# Altium footprint library Active.PcbLib: 325 footprints (part 8 of 23)
Each footprint in its own frame and in the unit in brackets; x right, y up, seen from the top. Pads: shape width x height; smd on the part's side, far side on the other; paste and mask are expansions set on the pad; w line width, h text height; cw(c..) or ccw(c..) is an arc to the next point about the centre after c.
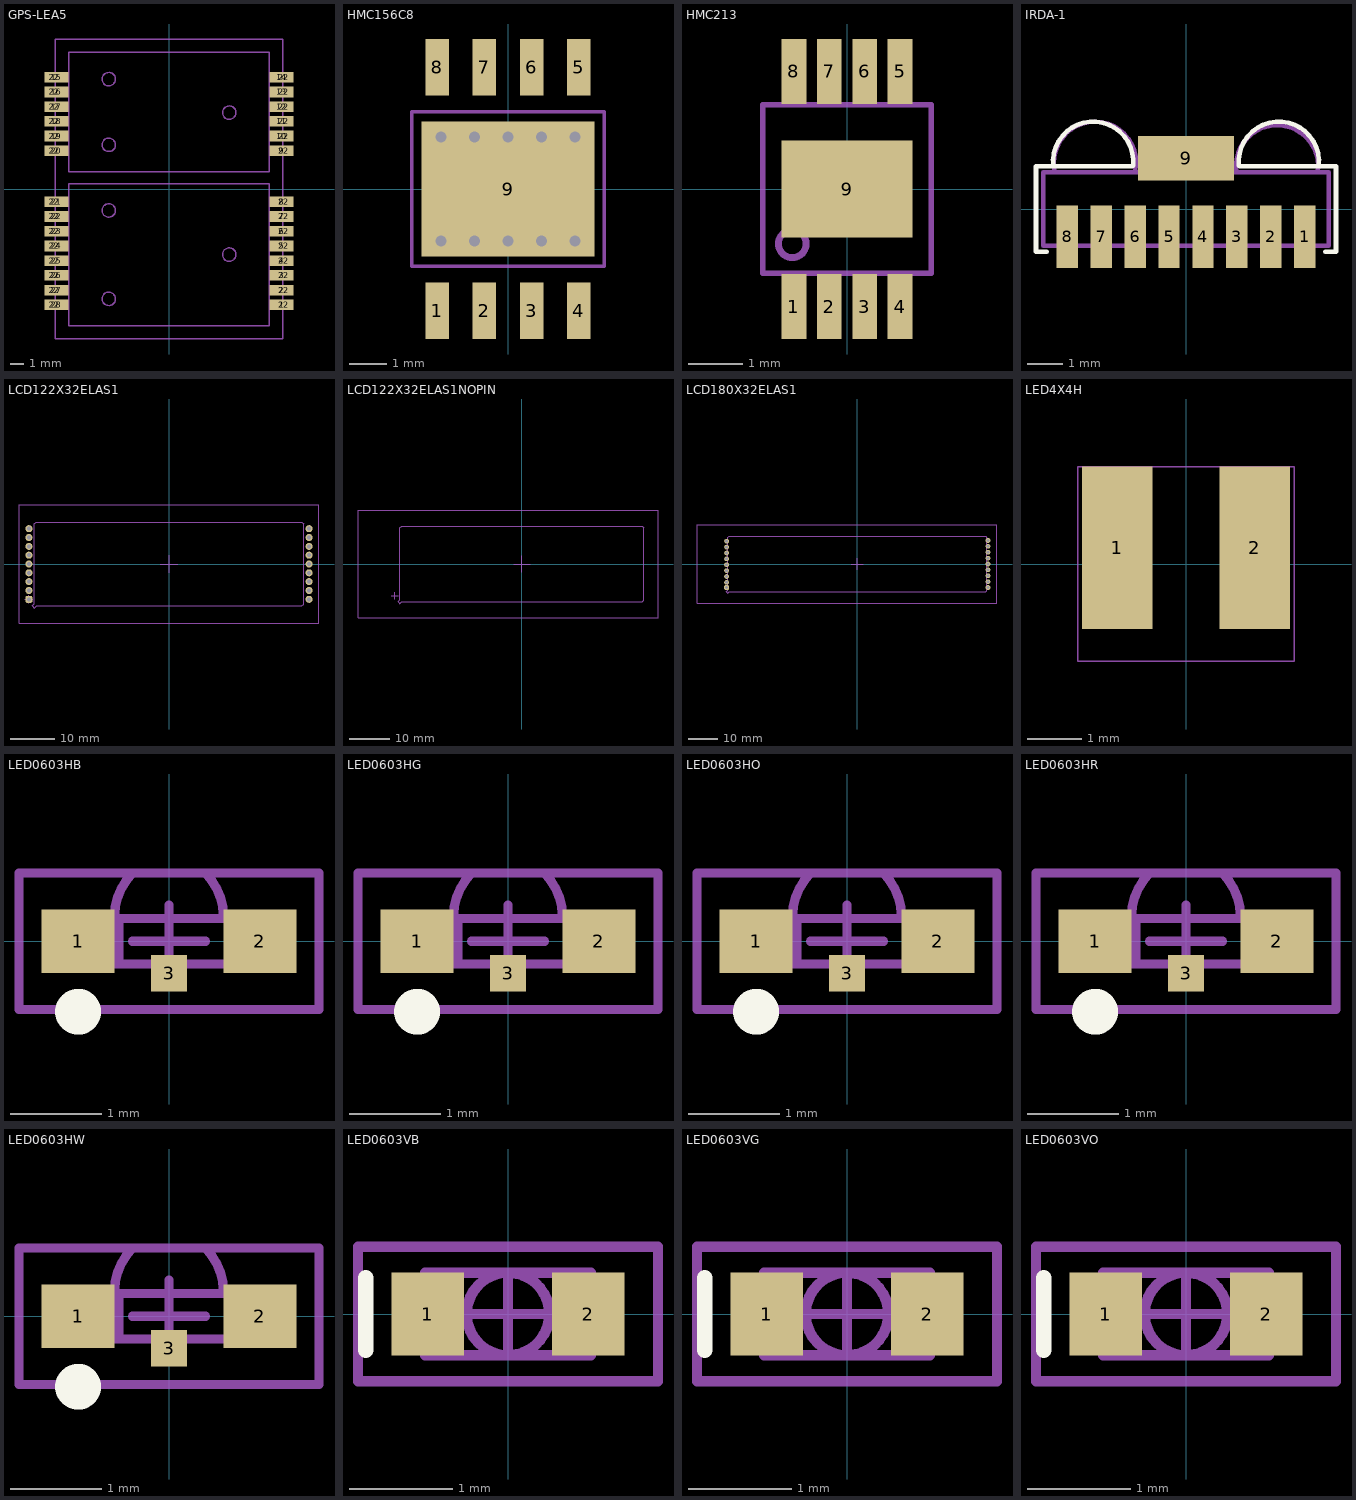
[diagram p7: the footprints below, top view; thin cyan lines are the x and y axes]

## GPS-LEA5 [mm] "17X22.4mm 28-pin GPS module"
height 3
pads (56):
  rect 1.8x0.8 smd paste-2: 1(8.4,-8.65) 2(8.4,-7.55) 3(8.4,-6.45) 4(8.4,-5.35) 5(8.4,-4.25) 6(8.4,-3.15) 7(8.4,-2.05) 8(8.4,-0.95) 9(8.4,2.85) 10(8.4,3.95) 11(8.4,5.05) 12(8.4,6.15) 13(8.4,7.25) 14(8.4,8.35) 15(-8.4,8.35) 16(-8.4,7.25) 17(-8.4,6.15) 18(-8.4,5.05) 19(-8.4,3.95) 20(-8.4,2.85) 21(-8.4,-0.95) 22(-8.4,-2.05) 23(-8.4,-3.15) 24(-8.4,-4.25) 25(-8.4,-5.35) 26(-8.4,-6.45) 27(-8.4,-7.55) 28(-8.4,-8.65)
  rect 1.5x0.8 on Top Paste: 22(-8.55,-8.65) 22(-8.55,-7.55) 22(-8.55,-6.45) 22(-8.55,-5.35) 22(-8.55,-4.25) 22(-8.55,-3.15) 22(-8.55,-2.05) 22(-8.55,-0.95) 22(-8.55,2.85) 22(-8.55,3.95) 22(-8.55,5.05) 22(-8.55,6.15) 22(-8.55,7.25) 22(-8.55,8.35) 22(8.55,-8.65) 22(8.55,-7.55) 22(8.55,-6.45) 22(8.55,-5.35) 22(8.55,-4.25) 22(8.55,-3.15) 22(8.55,-2.05) 22(8.55,-0.95) 22(8.55,2.85) 22(8.55,3.95) 22(8.55,5.05) 22(8.55,6.15) 22(8.55,7.25) 22(8.55,8.35)
Mechanical 13:
  circle w0.102: c-4.5,-8.2 r0.5
  circle w0.102: c-4.5,-1.6 r0.5
  circle w0.102: c4.5,-4.9 r0.5
  circle w0.102: c4.5,5.7 r0.5
  circle w0.102: c-4.5,8.2 r0.5
  circle w0.102: c-4.5,3.3 r0.5
  lines w0.102: -8.5,-11.2 -8.5,11.2 8.5,11.2 8.5,-11.2 -8.5,-11.2 ; -7.5,-10.2 -7.5,0.4 7.5,0.4 7.5,-10.2 -7.5,-10.2 ; -7.5,1.3 7.5,1.3 7.5,10.2 -7.5,10.2 -7.5,1.3
3D body: height 3.4, standoff 1, extent -7.5,1.3 7.5,10.2
3D body: height 3.4, standoff 1, extent -7.5,-10.2 7.5,0.4
3D body: height 1, standoff 0, extent -8.5,-11.2 8.5,11.2
3D body: height 3.41, standoff 3.4, extent -5,-8.7 -4,-7.7
3D body: height 3.41, standoff 3.4, extent -5,-2.1 -4,-1.1
3D body: height 3.41, standoff 3.4, extent 4,-5.4 5,-4.4
3D body: height 3.41, standoff 3.4, extent 4,5.2 5,6.2
3D body: height 3.41, standoff 3.4, extent -5,7.7 -4,8.7
3D body: height 3.41, standoff 3.4, extent -5,2.8 -4,3.8

## HMC156C8 [mil]
pads (9):
  rect 25x60 smd: 1(-75,-129) 2(-25,-129) 3(25,-129) 4(75,-129) 5(75,129) 6(25,129) 7(-25,129) 8(-75,129)
  rect 183x143 smd paste-196.85 mask-196.85: 9(0,0)
via 0,55.12 diameter 25.59 hole 11.81
via 70.87,55.12 diameter 25.59 hole 11.81
via 35.43,55.12 diameter 25.59 hole 11.81
via -35.43,55.12 diameter 25.59 hole 11.81
via -70.87,55.12 diameter 25.59 hole 11.81
via -70.87,-55.12 diameter 25.59 hole 11.81
via -35.43,-55.12 diameter 25.59 hole 11.81
via 35.43,-55.12 diameter 25.59 hole 11.81
via 70.87,-55.12 diameter 25.59 hole 11.81
via 0,-55.12 diameter 25.59 hole 11.81
Top Paste:
  region: -90.55,49.21 -82.68,49.21 -76.77,43.31 -64.96,43.31 -59.06,49.21 -53.15,49.21 -53.15,0 -90.55,0
  region: -56.1,49.21 -47.24,49.21 -41.34,43.31 -29.53,43.31 -23.62,49.21 -17.72,49.21 -17.72,0 -56.1,0
  region: -20.67,49.21 -11.81,49.21 -5.91,43.31 5.91,43.31 11.81,49.21 17.72,49.21 17.72,0 -20.67,0
  region: 14.76,49.21 23.62,49.21 29.53,43.31 41.34,43.31 47.24,49.21 53.15,49.21 53.15,0 14.76,0
  region: 90.55,49.21 82.68,49.21 76.77,43.31 64.96,43.31 59.06,49.21 53.15,49.21 53.15,0 90.55,0
  region: 90.55,-49.21 82.68,-49.21 76.77,-43.31 64.96,-43.31 59.06,-49.21 53.15,-49.21 53.15,0 90.55,0
  region: 56.1,-49.21 47.24,-49.21 41.34,-43.31 29.53,-43.31 23.62,-49.21 17.72,-49.21 17.72,0 56.1,0
  region: 20.67,-49.21 11.81,-49.21 5.91,-43.31 -5.91,-43.31 -11.81,-49.21 -17.72,-49.21 -17.72,0 20.67,0
  region: -14.76,-49.21 -23.62,-49.21 -29.53,-43.31 -41.34,-43.31 -47.24,-49.21 -53.15,-49.21 -53.15,0 -14.76,0
  region: -90.55,-49.21 -81.69,-49.21 -75.79,-43.31 -63.98,-43.31 -58.07,-49.21 -52.17,-49.21 -52.17,0 -90.55,0
  region: -90.55,61.02 -82.68,61.02 -76.77,66.93 -76.77,70.87 -90.55,70.87
  region: -64.96,70.87 -64.96,66.93 -59.06,61.02 -47.24,61.02 -41.34,66.93 -41.34,70.87
  region: -29.53,70.87 -29.53,66.93 -23.62,61.02 -11.81,61.02 -5.91,66.93 -5.91,70.87
  region: 5.91,70.87 5.91,66.93 11.81,61.02 23.62,61.02 29.53,66.93 29.53,70.87
  region: 41.34,70.87 41.34,66.93 47.24,61.02 59.06,61.02 64.96,66.93 64.96,70.87
  region: -64.96,-70.87 -64.96,-66.93 -59.06,-61.02 -47.24,-61.02 -41.34,-66.93 -41.34,-70.87
  region: -29.53,-70.87 -29.53,-66.93 -23.62,-61.02 -11.81,-61.02 -5.91,-66.93 -5.91,-70.87
  region: 5.91,-70.87 5.91,-66.93 11.81,-61.02 23.62,-61.02 29.53,-66.93 29.53,-70.87
  region: 41.34,-70.87 41.34,-66.93 47.24,-61.02 59.06,-61.02 64.96,-66.93 64.96,-70.87
  region: -90.55,-61.02 -82.68,-61.02 -76.77,-66.93 -76.77,-70.87 -90.55,-70.87
  region: 90.55,-61.02 82.68,-61.02 76.77,-66.93 76.77,-70.87 90.55,-70.87
  region: 90.55,61.02 82.68,61.02 76.77,66.93 76.77,70.87 90.55,70.87
Top Solder:
  drawing of 10 lines, arcs and shapes, not listed
Mechanical 13:
  circle w5: c-77,-58 r10
  lines w4: -102,-82 -102,82 102,82 102,-82 -102,-82
3D body: height 94.88, standoff 0, extent -102,-82 102,82
3D body: height 95.28, standoff 94.88, extent -87,-68 -67,-48

## HMC213 [mil]
pads (9):
  rect 18x47 smd mask+2: 1(-38.4,-85) 2(-12.8,-85) 3(12.8,-85) 4(38.4,-85) 5(38.4,85) 6(12.8,85) 7(-12.8,85) 8(-38.4,85)
  rect 95x70 smd mask+2: 9(0,0)
Mechanical 13:
  lines w4: -61,-61 -61,61 61,61 61,-61 -61,-61
  lines w5: -49.56,-39.69 cw(c-39.56,-39.69) -39.56,-29.69 cw(c-39.56,-39.69) -29.56,-39.69 cw(c-39.56,-39.69) -39.56,-49.69 cw(c-39.56,-39.69) -49.56,-39.69
3D body: height 43.31, standoff 5.91, extent -61,-61 61,61
3D body: height 45.28, standoff 43.31, extent -49.56,-49.69 -29.56,-29.69

## IRDA-1 [mm] "HSDL-3201#001"
height 2.5
pads (9):
  rect 0.6x1.75 smd: 1(3.325,-0.775) 2(2.375,-0.775) 3(1.425,-0.775) 4(0.475,-0.775) 5(-0.475,-0.775) 6(-1.425,-0.775) 7(-2.375,-0.775) 8(-3.325,-0.775)
  rect 2.7x1.25 smd: 9(0,1.425)
Top Overlay:
  lines w0.127: -3.9,-1.2 -4.2,-1.2 -4.2,1.2 -1.5,1.2 ; -3.718,1.203 cw(c-2.6,1.325) -1.481,1.207 ; 1.481,1.207 cw(c2.6,1.325) 3.718,1.203 ; 1.5,1.2 4.2,1.2 4.2,-1.2 3.9,-1.2
Mechanical 13:
  lines w0.127: -3.683,1.1 cw(c-2.55,1.3) -1.417,1.1 ; -1.05,1.025 -1.05,1.825 1.05,1.825 1.05,1.025 ; 1.411,1.04 cw(c2.55,1.2) 3.689,1.04 ; -4,-1.025 -4,1.025 4,1.025 4,-1.025 -4,-1.025
3D body: height 2.6, standoff 0, extent -4,-1.025 4,1.025
3D body: height 2.3, standoff 0.3, extent -3.683,1.025 -1.397,2.464
3D body: height 2.3, standoff 0.3, extent 1.397,1.04 3.708,2.362

## LCD122X32ELAS1 [mm]
pads (18):
  rrect50% 1.6x1.6 hole 0.9: 1(-31.75,-8)
  round 1.6 hole 0.9: 2(-31.75,-6) 3(-31.75,-4) 4(-31.75,-2) 5(-31.75,0) 6(-31.75,2) 7(-31.75,4) 8(-31.75,6) 9(-31.75,8) 10(31.75,8) 11(31.75,6) 12(31.75,4) 13(31.75,2) 14(31.75,0) 15(31.75,-2) 16(31.75,-4) 17(31.75,-6) 18(31.75,-8)
Mechanical 13:
  lines w0.102: -34,-13.4 34,-13.4 34,13.4 -34,13.4 -34,-13.4 ; -31,-9.5 -30.5,-9 -30.5,9.1 -30.1,9.5 30.1,9.5 30.5,9.1 30.5,-9.1 30.1,-9.5 -30,-9.5 -30.5,-10 -31,-9.5
Mechanical 15:
  lines w0.102: -32.65,-8 -30.875,-8 ; -31.75,-8.875 -31.75,-7.125 ; -2.032,0 2.032,0 ; 0,-2.032 0,2.032
3D body: height 10.8, standoff 0, extent -34.075,-13.375 33.925,13.425

## LCD122X32ELAS1NOPIN [mm]
Mechanical 13:
  lines w0.1: -41,-13.4 -41,13.4
  lines w0.102: -41,-13.4 34,-13.4 ; -41,13.4 34,13.4 34,-13.4 ; -34,-13.4 34,-13.4 ; -31,-9.5 -30.5,-10 -30,-9.5 30.1,-9.5 30.5,-9.1 30.5,9.1 30.1,9.5 -30.1,9.5 -30.5,9.1 -30.5,-9 -31,-9.5
Mechanical 15:
  lines w0.102: -32.65,-8 -30.875,-8 ; -31.75,-8.875 -31.75,-7.125 ; -2.032,0 2.032,0 ; 0,-2.032 0,2.032
3D body: height 14.8, standoff 4, extent -30.5,-9.5 30.5,9.5
3D body: height 14.8, standoff 4, extent -41,-13.4 34,13.4

## LCD180X32ELAS1 [mm]
height 10.8
pads (18):
  rrect50% 1.6x1.6 hole 0.9: 1(-44.45,-8)
  round 1.6 hole 0.9: 2(-44.45,-6.25) 3(-44.45,-4.25) 4(-44.45,-2.25) 5(-44.45,-0.25) 6(-44.45,1.75) 7(-44.45,3.75) 8(-44.45,5.75) 9(-44.45,7.75) 10(44.45,8) 11(44.45,6) 12(44.45,4) 13(44.45,2) 14(44.45,0) 15(44.45,-2) 16(44.45,-4) 17(44.45,-6) 18(44.45,-8)
Mechanical 13:
  lines w0.102: -54.5,-13.4 -54.5,13.4 47.5,13.4 47.5,-13.4 -54.5,-13.4 ; -44.5,-9.5 -44,-10 -43.5,-9.5 43.6,-9.5 44,-9.1 44,9.1 43.6,9.5 -43.6,9.5 -44,9.1 -44,-9 -44.5,-9.5
Mechanical 15:
  lines w0.102: -2.032,0 2.032,0 ; 0,-2.032 0,2.032
3D body: height 14.8, standoff 4, extent -54.5,-13.4 47.5,13.4
3D body: height 14.8, standoff 4, extent -44.01,-9.5 44,9.5

## LED4X4H [mm] "Sideled 4x4mm horizontal SMD"
height 4
pads (2):
  rect 1.3x3 smd: 1(-1.27,0.3) 2(1.27,0.3)
Mechanical 13:
  lines w0.025: -2,-1.8 -2,1.8 2,1.8 2,-1.8 -2,-1.8
3D body: height 3.8, standoff 1.4, extent -1.2,-1.825 1.2,-1.8
3D body: height 1, standoff 0, extent -2,-1.8 2,1.8
3D body: height 3, standoff 1, extent -2,-1.8 2,-0.3
3D body: height 4, standoff 3, extent -2,-1.8 2,1.8

## LED0603HB [mm] "LED chip 0603 1.6x1.0x0.6mm horizontal Blue"
height 1
pads (3):
  rect 0.8x0.7 smd: 1(-1,0) 2(1,0)
  rect 0.4x0.4 smd: 3(0,-0.35)
Top Overlay:
  circle w0.254: c-1,-0.775 r0.125
Mechanical 13:
  rectangle: -0.8,-0.25 -0.5,0.25
  lines w0.1: -0.8,-0.25 -0.8,0.25 0.8,0.25 0.8,-0.25 -0.8,-0.25
  lines w0.102: -0.6,0.25 -0.6,0.267 cw(c0.083,0.267) -0.4,0.75 0.4,0.75 cw(c-0.083,0.267) 0.6,0.267
Mechanical 15:
  lines w0.1: -0.4,0 0.4,0 ; 0,-0.4 0,0.4 ; -1.65,-0.75 -1.65,0.75 1.65,0.75 1.65,-0.75 -1.65,-0.75
3D body: height 0.61, standoff 0.6, extent -0.8,-0.25 -0.5,0.25
3D body: height 0.6, standoff 0, extent -0.8,-0.25 0.8,0.25
3D body: height 0.6, standoff 0, extent -0.6,0.25 0.6,0.75

## LED0603HG [mm] "LED chip 0603 1.6x1.0x0.6mm horizontal Green"
height 1
pads (3):
  rect 0.8x0.7 smd: 1(-1,0) 2(1,0)
  rect 0.4x0.4 smd: 3(0,-0.35)
Top Overlay:
  circle w0.254: c-1,-0.775 r0.125
Mechanical 13:
  rectangle: -0.8,-0.25 -0.5,0.25
  lines w0.1: -0.8,-0.25 0.8,-0.25 0.8,0.25 -0.8,0.25 -0.8,-0.25
  lines w0.102: -0.6,0.25 -0.6,0.267 cw(c0.083,0.267) -0.4,0.75 0.4,0.75 cw(c-0.083,0.267) 0.6,0.267
Mechanical 15:
  lines w0.1: -0.4,0 0.4,0 ; 0,-0.4 0,0.4 ; -1.65,-0.75 1.65,-0.75 1.65,0.75 -1.65,0.75 -1.65,-0.75
3D body: height 0.6, standoff 0, extent -0.6,0.25 0.6,0.75
3D body: height 0.6, standoff 0, extent -0.8,-0.25 0.8,0.25
3D body: height 0.61, standoff 0.6, extent -0.8,-0.25 -0.5,0.25

## LED0603HO [mm] "LED chip 0603 1.6x1.0x0.6mm horizontal Orange"
height 1
pads (3):
  rect 0.8x0.7 smd: 1(-1,0) 2(1,0)
  rect 0.4x0.4 smd: 3(0,-0.35)
Top Overlay:
  circle w0.254: c-1,-0.775 r0.125
Mechanical 13:
  rectangle: -0.8,-0.25 -0.5,0.25
  lines w0.1: -0.8,-0.25 0.8,-0.25 0.8,0.25 -0.8,0.25 -0.8,-0.25
  lines w0.102: -0.6,0.25 -0.6,0.267 cw(c0.083,0.267) -0.4,0.75 0.4,0.75 cw(c-0.083,0.267) 0.6,0.267
Mechanical 15:
  lines w0.1: -0.4,0 0.4,0 ; 0,-0.4 0,0.4 ; -1.65,-0.75 1.65,-0.75 1.65,0.75 -1.65,0.75 -1.65,-0.75
3D body: height 0.6, standoff 0, extent -0.6,0.25 0.6,0.75
3D body: height 0.6, standoff 0, extent -0.8,-0.25 0.8,0.25
3D body: height 0.61, standoff 0.6, extent -0.8,-0.25 -0.5,0.25

## LED0603HR [mm] "LED chip 0603 1.6x1.0x0.6mm horizontal Red"
height 1
pads (3):
  rect 0.8x0.7 smd: 1(-1,0) 2(1,0)
  rect 0.4x0.4 smd: 3(0,-0.35)
Top Overlay:
  circle w0.254: c-1,-0.775 r0.125
Mechanical 13:
  rectangle: -0.8,-0.25 -0.5,0.25
  lines w0.1: -0.8,-0.25 -0.8,0.25 0.8,0.25 0.8,-0.25 -0.8,-0.25
  lines w0.102: -0.6,0.25 -0.6,0.267 cw(c0.083,0.267) -0.4,0.75 0.4,0.75 cw(c-0.083,0.267) 0.6,0.267
Mechanical 15:
  lines w0.1: -0.4,0 0.4,0 ; 0,-0.4 0,0.4 ; -1.65,-0.75 -1.65,0.75 1.65,0.75 1.65,-0.75 -1.65,-0.75
3D body: height 0.61, standoff 0.6, extent -0.8,-0.25 -0.5,0.25
3D body: height 0.6, standoff 0, extent -0.8,-0.25 0.8,0.25
3D body: height 0.6, standoff 0, extent -0.6,0.25 0.6,0.75

## LED0603HW [mm] "LED chip 0603 1.6x1.0x0.6mm horizontal White"
height 1
pads (3):
  rect 0.8x0.7 smd: 1(-1,0) 2(1,0)
  rect 0.4x0.4 smd: 3(0,-0.35)
Top Overlay:
  circle w0.254: c-1,-0.775 r0.125
Mechanical 13:
  rectangle: -0.8,-0.25 -0.5,0.25
  lines w0.1: -0.8,-0.25 0.8,-0.25 0.8,0.25 -0.8,0.25 -0.8,-0.25
  lines w0.102: -0.6,0.25 -0.6,0.267 cw(c0.083,0.267) -0.4,0.75 0.4,0.75 cw(c-0.083,0.267) 0.6,0.267
Mechanical 15:
  lines w0.1: -0.4,0 0.4,0 ; 0,-0.4 0,0.4 ; -1.65,-0.75 1.65,-0.75 1.65,0.75 -1.65,0.75 -1.65,-0.75
3D body: height 0.6, standoff 0, extent -0.6,0.25 0.6,0.75
3D body: height 0.6, standoff 0, extent -0.8,-0.25 0.8,0.25
3D body: height 0.61, standoff 0.6, extent -0.8,-0.25 -0.5,0.25

## LED0603VB [mm] "LED chip 0603 1.6x0.8x0.6mm vertical Blue"
height 0.6
pads (2):
  rect 0.7x0.8 smd: 1(-0.775,0) 2(0.775,0)
Top Overlay:
  lines w0.15: -1.375,-0.35 -1.375,0.35
Mechanical 13:
  circle w0.102: c0,0 r0.4
  rectangle: -0.8,-0.4 -0.5,0.4
  lines w0.1: -0.8,-0.4 -0.8,0.4 0.8,0.4 0.8,-0.4 -0.8,-0.4
Mechanical 15:
  lines w0.1: -0.4,0 0.4,0 ; 0,-0.4 0,0.4 ; -1.45,-0.65 -1.45,0.65 1.45,0.65 1.45,-0.65 -1.45,-0.65
3D body: height 0.6, standoff 0.3, extent -0.8,-0.4 0.8,0.4
3D body: height 0.3, standoff 0, extent -0.8,-0.4 0.8,0.4

## LED0603VG [mm] "LED chip 0603 1.6x0.8x0.6mm vertical Green"
height 0.6
pads (2):
  rect 0.7x0.8 smd: 1(-0.775,0) 2(0.775,0)
Top Overlay:
  lines w0.15: -1.375,-0.35 -1.375,0.35
Mechanical 13:
  circle w0.102: c0,0 r0.4
  rectangle: -0.8,-0.4 -0.5,0.4
  lines w0.1: -0.8,-0.4 0.8,-0.4 0.8,0.4 -0.8,0.4 -0.8,-0.4
Mechanical 15:
  lines w0.1: -0.4,0 0.4,0 ; 0,-0.4 0,0.4 ; -1.45,-0.65 1.45,-0.65 1.45,0.65 -1.45,0.65 -1.45,-0.65
3D body: height 0.6, standoff 0.3, extent -0.8,-0.4 0.8,0.4
3D body: height 0.3, standoff 0, extent -0.8,-0.4 0.8,0.4

## LED0603VO [mm] "LED chip 0603 1.6x0.8x0.6mm vertical Orange"
height 0.6
pads (2):
  rect 0.7x0.8 smd: 1(-0.775,0) 2(0.775,0)
Top Overlay:
  lines w0.15: -1.375,-0.35 -1.375,0.35
Mechanical 13:
  circle w0.102: c0,0 r0.4
  rectangle: -0.8,-0.4 -0.5,0.4
  lines w0.1: -0.8,-0.4 0.8,-0.4 0.8,0.4 -0.8,0.4 -0.8,-0.4
Mechanical 15:
  lines w0.1: -0.4,0 0.4,0 ; 0,-0.4 0,0.4 ; -1.45,-0.65 1.45,-0.65 1.45,0.65 -1.45,0.65 -1.45,-0.65
3D body: height 0.6, standoff 0.3, extent -0.8,-0.4 0.8,0.4
3D body: height 0.3, standoff 0, extent -0.8,-0.4 0.8,0.4